# Altium footprint library Toi Library.PcbLib: 740 footprints (part 23 of 47)
Each footprint in its own frame and in the unit in brackets; x right, y up, seen from the top. Pads: shape width x height; smd on the part's side, far side on the other; paste and mask are expansions set on the pad; w line width, h text height; cw(c..) or ccw(c..) is an arc to the next point about the centre after c.
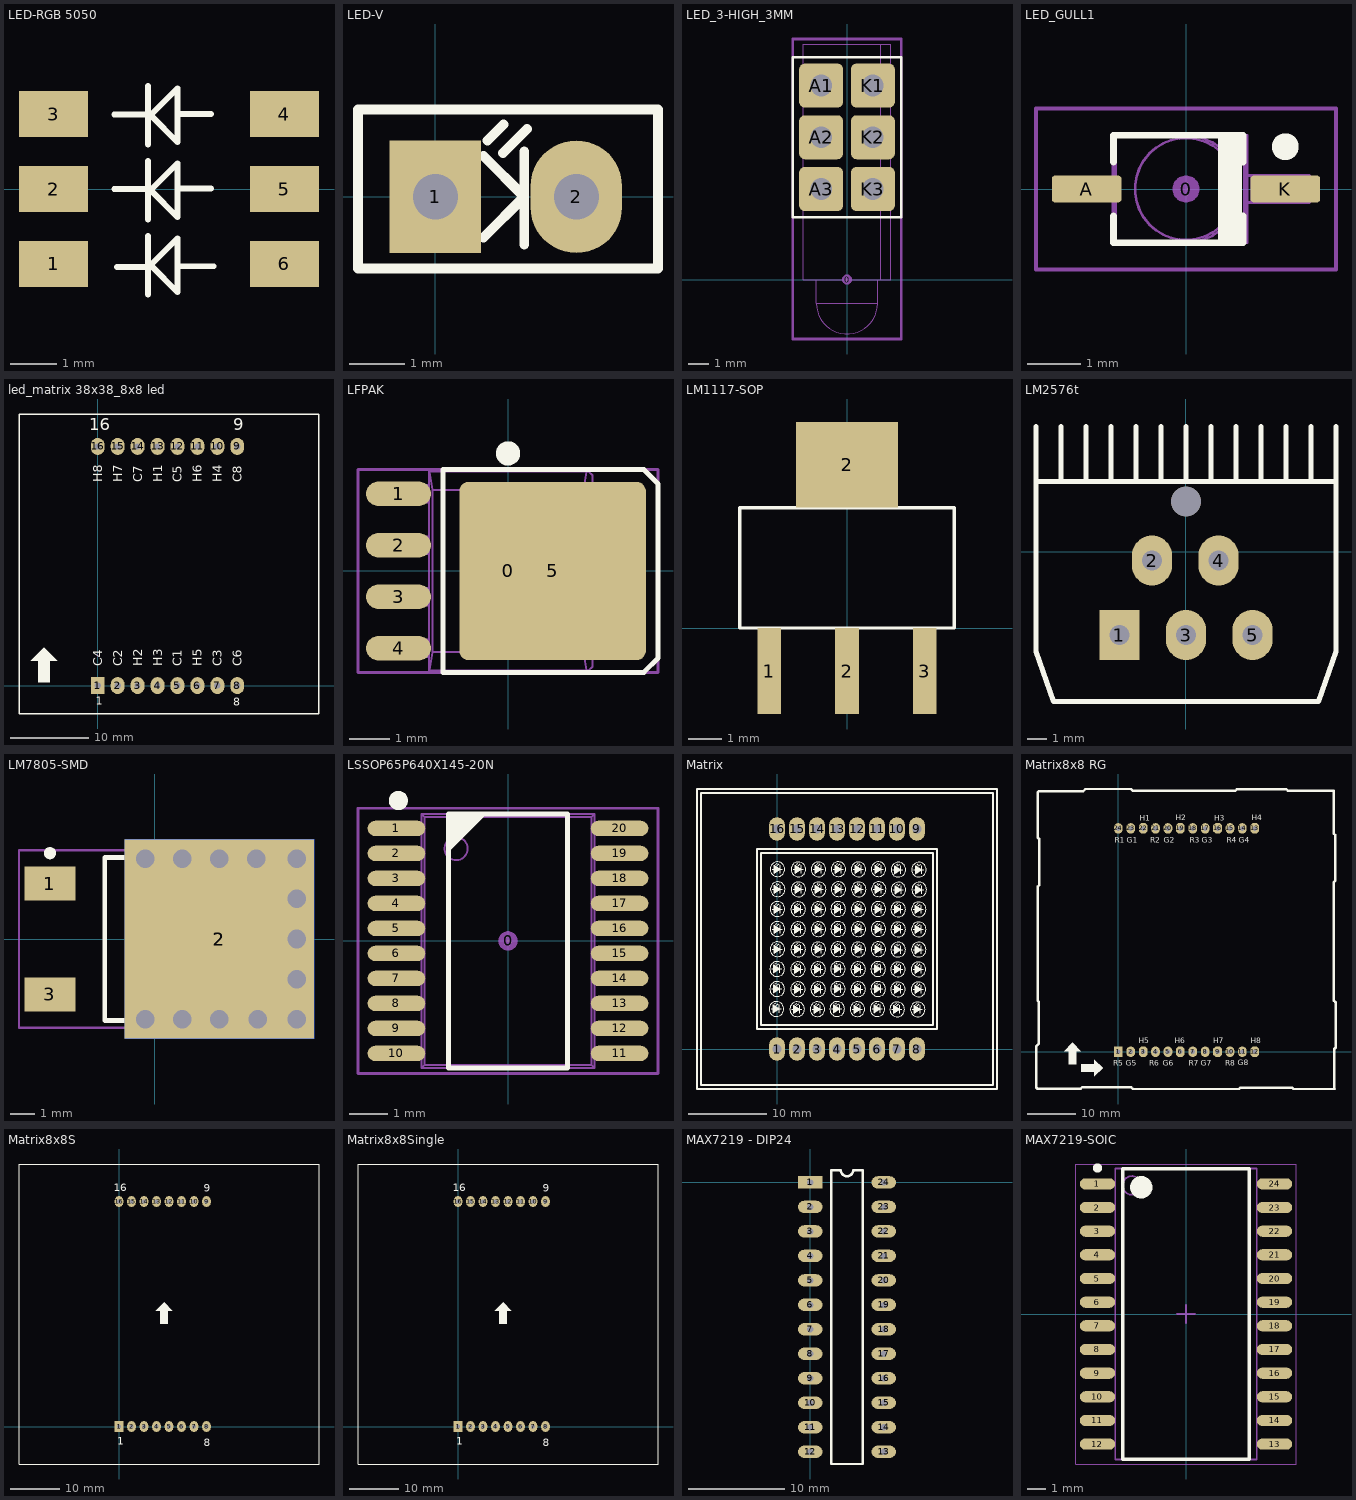
[diagram p22: the footprints below, top view; thin cyan lines are the x and y axes]

## LED-RGB 5050 [mm]
pads (6):
  rect 1.5x1 smd: 1(3.375,-1.625) 2(3.375,0) 3(3.375,1.625) 4(8.375,1.625) 5(8.375,0) 6(8.375,-1.625)
Top Overlay:
  lines w0.127: 4.687,0 5.41,0 ; 4.687,1.611 5.41,1.611 ; 4.75,-1.687 5.473,-1.687 ; 5.424,-2.285 5.424,-1.015 ; 5.424,-0.66 5.424,0.61 ; 5.424,0.965 5.424,2.235 ; 5.5,-1.676 6.059,-2.235 6.059,-1.066 5.5,-1.625 ; 5.5,-0.051 6.059,-0.61 6.059,0.559 5.5,0 ; 5.5,1.574 6.059,1.015 6.059,2.184 5.5,1.625 ; 6.059,0.014 6.782,0.014 ; 6.059,1.625 6.782,1.625 ; 6.121,-1.674 6.844,-1.674
3D body "User Library-APA102C.STEP": height 1.4, standoff -0.15, extent 3.125,-2.5 8.625,2.5

## LED-V [mil] "LED 2 PIN, Rectang Only colour"
height 300
pads (2):
  rect 65x80 hole 32: 1(0,0)
  oval 65x80 hole 32: 2(100,0)
Top Overlay:
  lines w7: 34,-29 63,0 34,29 ; 37,40 48.3,51.3 ; 48,31 65,48 ; 63,-34 63,32 ; -55,-51 158,-51 158,62 -55,62 -55,-51

## LED_3-HIGH_3MM [mil] "LED Circuit Board Indicator Tri-Level"
height 600
pads (7):
  round 20 on Mech15: 0(0,0)
  rrect25% 85x85 hole 42: A1(-50,375) A2(-50,275) A3(-50,175) K1(50,375) K2(50,275) K3(50,175)
Top Overlay:
  lines w5: -105,120 -105,430 105,430 105,120 -105,120
Mechanical 13:
  lines w1.97: -59.06,0 -59.06,-46.06 ; 59.06,0 59.06,-46.06 ; 65.35,0 65.35,455.12 ; -59.06,-46.06 ccw(c0,-46.06) 59.06,-46.06 ; -59.06,-46.06 59.06,-46.06 ; -85.04,0 -85.04,455.12 85.04,455.12 85.04,0 -85.04,0
Mechanical 15:
  lines w5: -105,-115 -105,465 105,465 105,-115 -105,-115
3D body: height 600, standoff -144.88, extent -85.04,-105.11 85.04,455.12

## LED_GULL1 [mm]
pads (3):
  round 0.508 on Mech15: 0(0,0)
  rrect25% 1.3x0.5 smd: A(-1.85,0) K(1.85,0)
Top Overlay:
  circle w0.4: c1.85,0.788 r0.05
  rectangle: 0.6,-1 1.041,1
  lines w0.127: -1.35,-0.5 -1.35,-1 1.067,-1 1.067,-0.5 ; -1.35,0.5 -1.35,1 1.067,1 1.067,0.5
Mechanical 13:
  circle w0.05: c0,0 r0.95
  lines w0.05: -1.9,-0.2 -1.9,0.2 ; -1.77,-0.2 -1.77,0.2 ; -1.499,-0.2 -1.499,0.2 ; -1.36,-0.2 -2.3,-0.2 -2.3,0.2 -1.36,0.2 ; -1.31,-1 -1.31,1 ; -0.001,-1 ccw(c0,0) 0.001,1 ; 1.09,-1 1.09,1 ; 1.14,-0.25 2.3,-0.25 2.3,0.25 1.14,0.25 ; 1.23,-0.25 1.23,0.25 ; 1.499,-0.25 1.499,0.25 ; 1.77,-0.25 1.77,0.25 ; 1.9,-0.25 1.9,0.25 ; -1.36,-1 1.14,-1 1.14,1 -1.36,1 -1.36,-1
Mechanical 15:
  lines w0.076: -2.794,-1.5 -2.794,1.5 2.794,1.5 2.794,-1.5 -2.794,-1.5
3D body "LED_GullWing.STEP": height 2.76, standoff 0, extent -2.3,-1 2.3,1

## led_matrix 38x38_8x8 led [mil]
pads (16):
  rect 70x85 hole 31: 1(0,0)
  oval 70x85 hole 31: 2(100,0) 3(200,0) 4(300,0) 5(400,0) 6(500,0) 7(600,0) 8(700,0) 9(700,1200) 10(600,1200) 11(500,1200) 12(400,1200) 13(300,1200) 14(200,1200) 15(100,1200) 16(0,1200)
Top Overlay:
  region: -336,124 -270,190 -268,190 -203,125 -203,124 -240,124 -240,18 -299,18 -299,124
  lines w7: -395,-140 -395,1360 1110,1360 1110,-140 -395,-140
  text "C6" at 722.49,96 h45
  text "H5" at 522.49,96 h45
  text "C1" at 422.49,96 h45
  text "C2" at 122.49,96 h45
  text "C3" at 622.49,96 h45
  text "C4" at 22.49,96 h45
  text "1" at -10,-95 h40
  text "8" at 680,-100 h40
  text "H3" at 322.49,96 h45
  text "H2" at 222.49,96 h45
  text "H1" at 322.49,1020 h45
  text "H4" at 622.49,1020 h45
  text "16" at -42,1281 h60
  text "9" at 679,1280 h60
  text "C5" at 422.49,1020 h45
  text "H6" at 522.49,1020 h45
  text "H7" at 122.49,1020 h45
  text "C7" at 222.49,1020 h45
  text "H8" at 22.49,1020 h45
  text "C8" at 722.49,1020 h45
3D body "User Library-38x38_8x8_LED.STEP": height 390.36, standoff -176.57, extent -398.03,-148.03 1109.84,1359.84

## LFPAK [mm] "Renesas LFPAK, a variant of SOIC-8; IPC Medium Density"
height 1.1
pads (6):
  round 1 on Mech15: 0(0,0)
  oval 1.6x0.6 smd: 1(-2.7,1.905) 2(-2.7,0.635) 3(-2.7,-0.635) 4(-2.7,-1.905)
  rrect10% 4.6x4.4 smd paste-0.8: 5(1.1,0)
Top Overlay:
  circle w0.3: c0,2.9 r0.15
  lines w0.127: -1.6,-2.5 -1.6,2.5 3.35,2.5 3.7,2.15 3.7,-2.15 3.35,-2.5 -1.6,-2.5
Mechanical 13:
  circle w0.05: c0,1.5 r0.338
  lines w0.05: -2.631,-2.115 -2.631,-1.695 ; -2.631,-0.845 -2.631,-0.425 ; -2.631,0.425 -2.631,0.845 ; -2.631,1.695 -2.631,2.115 ; -2.543,-2.115 -2.543,-1.695 ; -2.543,-0.845 -2.543,-0.425 ; -2.543,0.425 -2.543,0.845 ; -2.543,1.695 -2.543,2.115 ; -2.506,-2.115 -2.506,-1.695 ; -2.506,-0.845 -2.506,-0.425 ; -2.506,0.425 -2.506,0.845 ; -2.506,1.695 -2.506,2.115 ; -2.217,-2.115 -2.217,-1.695 ; -2.217,-0.845 -2.217,-0.425 ; -2.217,0.425 -2.217,0.845 ; -2.217,1.695 -2.217,2.115 ; -1.95,-2.115 -3,-2.115 -3,-1.695 -1.95,-1.695 ; -1.95,-0.845 -3,-0.845 -3,-0.425 -1.95,-0.425 ; -1.95,0.425 -3,0.425 -3,0.845 -1.95,0.845 ; -1.95,1.695 -3,1.695 -3,2.115 -1.95,2.115 ; -1.937,-2.45 -1.858,-2.003 ; -1.937,2.45 -1.858,2.003 ; 1.937,-2.45 1.858,-2.003 ; 1.937,2.45 1.858,2.003 ; 2.085,-1.4 2.085,-2.358 1.993,-2.45 -1.95,-2.45 -1.95,2.45 1.993,2.45 2.085,2.358 2.085,1.4 ; 2.085,-0.6 2.085,0.6 ; -1.858,-2.003 -1.858,2.003 ; -1.858,-2.003 1.858,-2.003 ; -1.858,2.003 1.858,2.003 ; 1.858,-2.003 1.858,2.003 ; 2.028,-1.4 2.3,-1.4 2.3,-2.1 2.55,-2.1 3,-1.65 3,1.65 2.55,2.1 2.3,2.1 2.3,1.4 2.028,1.4 2.028,0.6 2.1,0.6 2.1,-0.6 2.028,-0.6 2.028,-1.4
Mechanical 15:
  lines w0.076: -3.7,-2.5 -3.7,2.5 3.7,2.5 3.7,-2.5 -3.7,-2.5
3D body "LFPAK.STEP": height 1.1, standoff 0, extent -3,-2.45 3,2.45

## LM1117-SOP [mm]
pads (4):
  rect 0.7x2.54 smd: 1(-2.3,-1.27) 2(0,-1.27) 3(2.3,-1.27)
  rect 3x2.54 smd: 2(0,4.826)
Top Overlay:
  lines w0.1: -3.175,0 3.175,0 3.175,3.556 -3.175,3.556 -3.175,0
3D body "SW3DPS-SOT-223-DEFAULT.step": height 1.68, standoff 0, extent -3.25,-1.778 3.25,5.182

## LM2576t [mil]
pads (6):
  rect 80x100 hole 40: 1(-132,-167.09)
  oval 80x100 hole 40: 2(-67,-18) 3(1,-167) 4(66,-18) 5(134,-167)
  round 59.06 hole 59.06: ""(1,100)
Top Overlay:
  lines w10: -299,140 301,140 ; -299,250 -299,-200 -264,-300 266,-300 301,-200 301,250 ; -249,140 -249,250 ; -199,140 -199,250 ; -149,140 -149,250 ; -99,140 -99,250 ; -49,140 -49,250 ; 1,140 1,250 ; 51,140 51,250 ; 101,140 101,250 ; 151,140 151,250 ; 201,140 201,250 ; 251,140 251,250
3D body "SW3dPS-TO220-5.STEP": height 859.05, standoff -85.43, extent -199,-174.91 201,149.5

## LM7805-SMD [mm]
pads (4):
  rect 2.1x1.4 smd: 1(-4.3,2.28) 3(-4.3,-2.28)
  rect 7.8x8.2 smd: 2(2.667,0)
  rect 7.8x8.2 smd far side: 2(2.667,0)
via -0.381,3.302 diameter 1.27 hole 0.762
via 5.842,-3.302 diameter 1.27 hole 0.762
via 4.255,-3.302 diameter 1.27 hole 0.762
via 2.667,-3.302 diameter 1.27 hole 0.762
via 1.143,-3.302 diameter 1.27 hole 0.762
via -0.381,-3.302 diameter 1.27 hole 0.762
via 5.842,3.302 diameter 1.27 hole 0.762
via 4.191,3.302 diameter 1.27 hole 0.762
via 2.667,3.302 diameter 1.27 hole 0.762
via 1.143,3.302 diameter 1.27 hole 0.762
via 5.842,0 diameter 1.27 hole 0.762
via 5.842,1.651 diameter 1.27 hole 0.762
via 5.842,-1.651 diameter 1.27 hole 0.762
Top Overlay:
  circle w0.25: c-4.3,3.53 r0.125
  lines w0.2: -1.2,-3.35 -2.05,-3.35 -2.05,3.35 -1.2,3.35
  lines w0.254: 1.143,3.302 1.206,3.302 ; 4.191,-3.302 4.255,-3.302
Mechanical 13:
  lines w0.1: -2.05,-3.375 4.17,-3.375 4.17,3.375 -2.05,3.375 -2.05,-3.375
Mechanical 15:
  lines w0.1: -5.575,-3.65 5.575,-3.65 5.575,3.65 -5.575,3.65 -5.575,-3.65
3D body "DPAK.stp": height 2.31, standoff 0, extent -4.713,-3.3 5,3.3

## LSSOP65P640X145-20N [mm] "LSSOP, 20-Leads, Body 6.6x4.5mm (max), Pitch 0.65mm, IPC Medium Density"
height 1.45
pads (21):
  round 0.508 on Mech15 mask+0.127: 0(0,0)
  oval 1.5x0.4 smd paste-1 mask+0.127: 1(-2.9,2.925) 2(-2.9,2.275) 3(-2.9,1.625) 4(-2.9,0.975) 5(-2.9,0.325) 6(-2.9,-0.325) 7(-2.9,-0.975) 8(-2.9,-1.625) 9(-2.9,-2.275) 10(-2.9,-2.925) 11(2.9,-2.925) 12(2.9,-2.275) 13(2.9,-1.625) 14(2.9,-0.975) 15(2.9,-0.325) 16(2.9,0.325) 17(2.9,0.975) 18(2.9,1.625) 19(2.9,2.275) 20(2.9,2.925)
Top Overlay:
  circle w0.25: c-2.85,3.65 r0.125
  region: -1.55,3.3 -0.55,3.3 -1.55,2.3
  lines w0.127: -1.55,-3.3 -1.55,3.3 1.55,3.3 1.55,-3.3 -1.55,-3.3
Top Paste:
  region: 3.5,-0.825 2.3,-0.825 2.3,-1.125 3.5,-1.125
  region: 3.5,-0.175 2.3,-0.175 2.3,-0.475 3.5,-0.475
  region: 3.5,0.475 2.3,0.475 2.3,0.175 3.5,0.175
  region: 3.5,1.125 2.3,1.125 2.3,0.825 3.5,0.825
  region: 3.5,1.775 2.3,1.775 2.3,1.475 3.5,1.475
  region: 3.5,2.425 2.3,2.425 2.3,2.125 3.5,2.125
  region: 3.5,3.075 2.3,3.075 2.3,2.775 3.5,2.775
  rectangle: -3.5,2.775 -2.3,3.075
  rectangle: -3.5,2.125 -2.3,2.425
  rectangle: -3.5,1.475 -2.3,1.775
  rectangle: -3.5,0.825 -2.3,1.125
  rectangle: -3.5,0.175 -2.3,0.475
  rectangle: -3.5,-0.475 -2.3,-0.175
  rectangle: -3.5,-1.125 -2.3,-0.825
  rectangle: -3.5,-3.075 -2.3,-2.775
  rectangle: -3.5,-2.425 -2.3,-2.125
  rectangle: -3.5,-1.775 -2.3,-1.475
  region: 3.5,-1.475 2.3,-1.475 2.3,-1.775 3.5,-1.775
  region: 3.5,-2.125 2.3,-2.125 2.3,-2.425 3.5,-2.425
  region: 3.5,-2.775 2.3,-2.775 2.3,-3.075 3.5,-3.075
Mechanical 13:
  drawing of 153 lines, arcs and shapes, not listed
Mechanical 15:
  lines w0.076: -3.9,-3.45 -3.9,3.45 3.9,3.45 3.9,-3.45 -3.9,-3.45
3D body: height 1.45, standoff 0, extent -3.3,-3.3 3.3,3.3

## Matrix [mm]
pads (16):
  oval 2x3 hole 1.2: 1(0,0) 2(2.54,0) 3(5.08,0) 4(7.62,0) 5(10.16,0) 6(12.7,0) 7(15.24,0) 8(17.78,0) 9(17.78,27.94) 10(15.24,27.94) 11(12.7,27.94) 12(10.16,27.94) 13(7.62,27.94) 14(5.08,27.94) 15(2.54,27.94) 16(0,27.94)
Top Overlay:
  drawing of 592 lines, arcs and shapes, not listed
3D body "User Library-Bicolor-LED-Matrix.step": height 8.02, standoff -5.98, extent -7.364,-2.157 24.636,29.843

## Matrix8x8 RG [mil] "Matran 8x8 2mau,Body 60 X 60mm"
height 300
pads (24):
  rect 70x85 hole 37.4: 1(0,0)
  oval 70x85 hole 37.4: 2(100,0) 4(300,0) 5(400,0) 7(600,0) 8(700,0) 10(900,0) 11(1000,0) 14(1000,1800) 15(900,1800) 17(700,1800) 18(600,1800) 20(400,1800) 21(300,1800) 23(100,1800) 24(0,1800)
  oct 70x85 hole 37.4: 3(200,0) 6(500,0) 9(800,0) 12(1100,0) 13(1100,1800) 16(800,1800) 19(500,1800) 22(200,1800)
Top Overlay:
  region: -193,-63 -127,-129 -127,-131 -192,-196 -193,-196 -193,-159 -299,-159 -299,-100 -193,-100
  region: -437,5 -371,71 -369,71 -304,6 -304,5 -341,5 -341,-101 -400,-101 -400,5
  lines w20: -650,-300 -661,-289 -661,45 -640,66 -640,403 -650,413 -650,1331 -639,1342 -639,1716 -650,1727 -650,2090 -640,2100 -283,2100 -265,2118 103,2118 119,2102 941,2102 955,2116 1355,2116 1369,2102 1736,2102 1738,2100 1738,1757 1749,1746 1749,1379 1738,1368 1738,412 1752,398 1752,33 1742,23 1742,-299 1743,-300 1412,-300 1400,-288 984,-288 972,-300 117,-300 103,-286 -292,-286 -304,-298 -648,-298
  text "R4" at 874,1685 h45
  text "G4" at 970,1686 h45
  text "H4" at 1076,1865 h45
  text "R3" at 576,1684 h45
  text "G3" at 672,1685 h45
  text "H3" at 773,1864 h45
  text "R2" at 258,1685 h45
  text "G2" at 366,1685 h45
  text "H2" at 464,1865 h45
  text "H1" at 174,1864 h45
  text "G1" at 68,1685 h45
  text "R1" at -28,1684 h45
  text "R5" at -40,-112 h45
  text "G5" at 60,-111 h45
  text "H5" at 166,68 h45
  text "H6" at 456,69 h45
  text "G6" at 358,-111 h45
  text "R6" at 250,-111 h45
  text "H7" at 765,68 h45
  text "G7" at 664,-111 h45
  text "R7" at 568,-112 h45
  text "H8" at 1068,69 h45
  text "G8" at 962,-110 h45
  text "R8" at 863,-111 h45
Bottom Overlay:
  text "R4" at 943,1685 h45
  text "G4" at 1039,1686 h45
  text "H4" at 1145,1865 h45
  text "R3" at 645,1684 h45
  text "G3" at 741,1685 h45
  text "H3" at 842,1864 h45
  text "R2" at 327,1685 h45
  text "G2" at 435,1685 h45
  text "H2" at 533,1865 h45
  text "H1" at 243,1864 h45
  text "G1" at 137,1685 h45
  text "R1" at 41,1684 h45
  text "R5" at 29,-112 h45
  text "G5" at 129,-111 h45
  text "H5" at 235,68 h45
  text "H6" at 525,69 h45
  text "G6" at 427,-111 h45
  text "R6" at 319,-111 h45
  text "H7" at 834,68 h45
  text "G7" at 733,-111 h45
  text "R7" at 637,-112 h45
  text "H8" at 1137,69 h45
  text "G8" at 1031,-110 h45
  text "R8" at 932,-111 h45
3D body: height 300, standoff 100, extent -648,-298 1752,2102
3D body: height 309, standoff 299, extent -648,-293 1752,2102
3D body: height 310, standoff 299, extent -604,1840.48 -396.41,2045.48
3D body: height 310, standoff 299, extent -298.97,1837.69 -91.38,2042.69
3D body: height 310, standoff 299, extent 2.87,1840.59 210.46,2045.59
3D body: height 310, standoff 299, extent 295.44,1839.3 503.03,2044.3
3D body: height 310, standoff 299, extent 592.24,1837 799.83,2042
3D body: height 310, standoff 299, extent 892,1832 1099.59,2037
3D body: height 310, standoff 299, extent 1182,1837 1389.59,2042
3D body: height 310, standoff 299, extent 1493.67,1837.8 1701.26,2042.8
3D body: height 310, standoff 299, extent 1490.16,1539.32 1697.75,1744.32
3D body: height 310, standoff 299, extent 1178.49,1538.52 1386.08,1743.52
3D body: height 310, standoff 299, extent 888.49,1533.52 1096.08,1738.52
3D body: height 310, standoff 299, extent 588.73,1538.52 796.32,1743.52
3D body: height 310, standoff 299, extent 291.93,1540.82 499.52,1745.82
3D body: height 310, standoff 299, extent -0.64,1542.11 206.95,1747.11
3D body: height 310, standoff 299, extent -302.48,1539.22 -94.89,1744.22
3D body: height 310, standoff 299, extent -607.52,1542 -399.92,1747
3D body: height 310, standoff 299, extent 1490.16,1239.32 1697.75,1444.32
3D body: height 310, standoff 299, extent 1178.49,1238.52 1386.08,1443.52
3D body: height 310, standoff 299, extent 888.49,1233.52 1096.08,1438.52
3D body: height 310, standoff 299, extent 588.73,1238.52 796.32,1443.52
3D body: height 310, standoff 299, extent 291.93,1240.82 499.52,1445.82
3D body: height 310, standoff 299, extent -0.64,1242.11 206.95,1447.11
3D body: height 310, standoff 299, extent -302.48,1239.22 -94.89,1444.22
3D body: height 310, standoff 299, extent -607.52,1242 -399.92,1447
3D body: height 310, standoff 299, extent 1490.16,939.32 1697.75,1144.32
3D body: height 310, standoff 299, extent 1178.49,938.52 1386.08,1143.52
3D body: height 310, standoff 299, extent 888.49,933.52 1096.08,1138.52
3D body: height 310, standoff 299, extent 588.73,938.52 796.32,1143.52
3D body: height 310, standoff 299, extent 291.93,940.82 499.52,1145.82
3D body: height 310, standoff 299, extent -0.64,942.11 206.95,1147.11
3D body: height 310, standoff 299, extent -302.48,939.22 -94.89,1144.22
3D body: height 310, standoff 299, extent -607.52,942 -399.92,1147
3D body: height 310, standoff 299, extent 1490.16,639.32 1697.75,844.32
3D body: height 310, standoff 299, extent 1178.49,638.52 1386.08,843.52
3D body: height 310, standoff 299, extent 888.49,633.52 1096.08,838.52
3D body: height 310, standoff 299, extent 588.73,638.52 796.32,843.52
3D body: height 310, standoff 299, extent 291.93,640.82 499.52,845.82
3D body: height 310, standoff 299, extent -0.64,642.11 206.95,847.11
3D body: height 310, standoff 299, extent -302.48,639.22 -94.89,844.22
3D body: height 310, standoff 299, extent -607.52,642 -399.92,847
3D body: height 310, standoff 299, extent 1490.16,339.32 1697.75,544.32
3D body: height 310, standoff 299, extent 1178.49,338.52 1386.08,543.52
3D body: height 310, standoff 299, extent 888.49,333.52 1096.08,538.52
3D body: height 310, standoff 299, extent 588.73,338.52 796.32,543.52
3D body: height 310, standoff 299, extent 291.93,340.82 499.52,545.82
3D body: height 310, standoff 299, extent -0.64,342.11 206.95,547.11
3D body: height 310, standoff 299, extent -302.48,339.22 -94.89,544.22
3D body: height 310, standoff 299, extent -607.52,342 -399.92,547
3D body: height 310, standoff 299, extent 1490.16,39.32 1697.75,244.32
3D body: height 310, standoff 299, extent 1178.49,38.52 1386.08,243.52
3D body: height 310, standoff 299, extent 888.49,33.52 1096.08,238.52
3D body: height 310, standoff 299, extent 588.73,38.52 796.32,243.52
3D body: height 310, standoff 299, extent 291.93,40.82 499.52,245.82
3D body: height 310, standoff 299, extent -0.64,42.11 206.95,247.11
3D body: height 310, standoff 299, extent -302.48,39.22 -94.89,244.22
3D body: height 310, standoff 299, extent -607.52,42 -399.92,247
3D body: height 310, standoff 299, extent 1490.16,-260.68 1697.75,-55.68
3D body: height 310, standoff 299, extent 1178.49,-261.48 1386.08,-56.48
3D body: height 310, standoff 299, extent 888.49,-266.48 1096.08,-61.48
3D body: height 310, standoff 299, extent 588.73,-261.48 796.32,-56.48
3D body: height 310, standoff 299, extent 291.93,-259.18 499.52,-54.18
3D body: height 310, standoff 299, extent -0.64,-257.89 206.95,-52.89
3D body: height 310, standoff 299, extent -302.48,-260.78 -94.89,-55.78
3D body: height 310, standoff 299, extent -607.52,-258 -399.92,-53
3D body: height 150, standoff -100, extent 1086.47,1785.67 1116.47,1815.67
3D body: height 150, standoff -100, extent 1086.33,-14.47 1116.33,15.53
3D body: height 150, standoff -100, extent 986.33,-14.47 1016.33,15.53
3D body: height 150, standoff -100, extent 886.33,-14.47 916.33,15.53
3D body: height 150, standoff -100, extent 786.33,-14.47 816.33,15.53
3D body: height 150, standoff -100, extent 686.33,-14.47 716.33,15.53
3D body: height 150, standoff -100, extent 586.33,-14.47 616.33,15.53
3D body: height 150, standoff -100, extent 486.33,-14.47 516.33,15.53
3D body: height 150, standoff -100, extent 386.33,-14.47 416.33,15.53
3D body: height 150, standoff -100, extent 286.33,-14.47 316.33,15.53
3D body: height 150, standoff -100, extent 186.33,-14.47 216.33,15.53
3D body: height 150, standoff -100, extent 86.33,-14.47 116.33,15.53
3D body: height 150, standoff -100, extent -13.67,-14.47 16.33,15.53
3D body: height 150, standoff -100, extent 986.33,1785.53 1016.33,1815.53
3D body: height 150, standoff -100, extent 886.33,1785.53 916.33,1815.53
3D body: height 150, standoff -100, extent 786.33,1785.53 816.33,1815.53
3D body: height 150, standoff -100, extent 686.33,1785.53 716.33,1815.53
3D body: height 150, standoff -100, extent 586.33,1785.53 616.33,1815.53
3D body: height 150, standoff -100, extent 486.33,1785.53 516.33,1815.53
3D body: height 150, standoff -100, extent 386.33,1785.53 416.33,1815.53
3D body: height 150, standoff -100, extent 286.33,1785.53 316.33,1815.53
3D body: height 150, standoff -100, extent 186.33,1785.53 216.33,1815.53
3D body: height 150, standoff -100, extent 86.33,1785.53 116.33,1815.53
3D body: height 150, standoff -100, extent -13.67,1785.53 16.33,1815.53

## Matrix8x8S [mil] "Matran 8x8, Body 60 X 60mm"
height 300
pads (16):
  rect 70x85 hole 31: 1(0,0)
  oval 70x85 hole 31: 2(100,0) 3(200,0) 4(300,0) 5(400,0) 6(500,0) 7(600,0) 8(700,0) 9(700,1800) 10(600,1800) 11(500,1800) 12(400,1800) 13(300,1800) 14(200,1800) 15(100,1800) 16(0,1800)
Top Overlay:
  region: 294,927 360,993 362,993 427,928 427,927 390,927 390,821 331,821 331,927
  lines w7: -800,-300 -800,2100 ; -800,-300 -800,2100 ; -800,-300 1600,-300 ; -800,-300 1600,-300 ; -800,2100 1600,2100 ; -800,2100 1600,2100 ; 1600,-300 1600,2100 ; 1600,-300 1600,2100
  text "16" at -42,1881 h60
  text "9" at 679,1880 h60
  text "8" at 678,-156 h60
  text "1" at -15,-144 h60
3D body: height 300, standoff 100, extent -800,-300 1600,2100
3D body: height 309, standoff 299, extent -800,-295 1600,2100
3D body: height 310, standoff 299, extent -756,1838.48 -548.41,2043.48
3D body: height 310, standoff 299, extent -450.97,1835.69 -243.38,2040.69
3D body: height 310, standoff 299, extent -149.13,1838.59 58.46,2043.59
3D body: height 310, standoff 299, extent 143.44,1837.3 351.03,2042.3
3D body: height 310, standoff 299, extent 440.24,1835 647.83,2040
3D body: height 310, standoff 299, extent 740,1830 947.59,2035
3D body: height 310, standoff 299, extent 1030,1835 1237.59,2040
3D body: height 310, standoff 299, extent 1341.67,1835.8 1549.26,2040.8
3D body: height 310, standoff 299, extent 1338.16,1537.32 1545.75,1742.32
3D body: height 310, standoff 299, extent 1026.49,1536.52 1234.08,1741.52
3D body: height 310, standoff 299, extent 736.49,1531.52 944.08,1736.52
3D body: height 310, standoff 299, extent 436.73,1536.52 644.32,1741.52
3D body: height 310, standoff 299, extent 139.93,1538.82 347.52,1743.82
3D body: height 310, standoff 299, extent -152.64,1540.11 54.95,1745.11
3D body: height 310, standoff 299, extent -454.48,1537.22 -246.89,1742.22
3D body: height 310, standoff 299, extent -759.52,1540 -551.92,1745
3D body: height 310, standoff 299, extent 1338.16,1237.32 1545.75,1442.32
3D body: height 310, standoff 299, extent 1026.49,1236.52 1234.08,1441.52
3D body: height 310, standoff 299, extent 736.49,1231.52 944.08,1436.52
3D body: height 310, standoff 299, extent 436.73,1236.52 644.32,1441.52
3D body: height 310, standoff 299, extent 139.93,1238.82 347.52,1443.82
3D body: height 310, standoff 299, extent -152.64,1240.11 54.95,1445.11
3D body: height 310, standoff 299, extent -454.48,1237.22 -246.89,1442.22
3D body: height 310, standoff 299, extent -759.52,1240 -551.92,1445
3D body: height 310, standoff 299, extent 1338.16,937.32 1545.75,1142.32
3D body: height 310, standoff 299, extent 1026.49,936.52 1234.08,1141.52
3D body: height 310, standoff 299, extent 736.49,931.52 944.08,1136.52
3D body: height 310, standoff 299, extent 436.73,936.52 644.32,1141.52
3D body: height 310, standoff 299, extent 139.93,938.82 347.52,1143.82
3D body: height 310, standoff 299, extent -152.64,940.11 54.95,1145.11
3D body: height 310, standoff 299, extent -454.48,937.22 -246.89,1142.22
3D body: height 310, standoff 299, extent -759.52,940 -551.92,1145
3D body: height 310, standoff 299, extent 1338.16,637.32 1545.75,842.32
3D body: height 310, standoff 299, extent 1026.49,636.52 1234.08,841.52
3D body: height 310, standoff 299, extent 736.49,631.52 944.08,836.52
3D body: height 310, standoff 299, extent 436.73,636.52 644.32,841.52
3D body: height 310, standoff 299, extent 139.93,638.82 347.52,843.82
3D body: height 310, standoff 299, extent -152.64,640.11 54.95,845.11
3D body: height 310, standoff 299, extent -454.48,637.22 -246.89,842.22
3D body: height 310, standoff 299, extent -759.52,640 -551.92,845
3D body: height 310, standoff 299, extent 1338.16,337.32 1545.75,542.32
3D body: height 310, standoff 299, extent 1026.49,336.52 1234.08,541.52
3D body: height 310, standoff 299, extent 736.49,331.52 944.08,536.52
3D body: height 310, standoff 299, extent 436.73,336.52 644.32,541.52
3D body: height 310, standoff 299, extent 139.93,338.82 347.52,543.82
3D body: height 310, standoff 299, extent -152.64,340.11 54.95,545.11
3D body: height 310, standoff 299, extent -454.48,337.22 -246.89,542.22
3D body: height 310, standoff 299, extent -759.52,340 -551.92,545
3D body: height 310, standoff 299, extent 1338.16,37.32 1545.75,242.32
3D body: height 310, standoff 299, extent 1026.49,36.52 1234.08,241.52
3D body: height 310, standoff 299, extent 736.49,31.52 944.08,236.52
3D body: height 310, standoff 299, extent 436.73,36.52 644.32,241.52
3D body: height 310, standoff 299, extent 139.93,38.82 347.52,243.82
3D body: height 310, standoff 299, extent -152.64,40.11 54.95,245.11
3D body: height 310, standoff 299, extent -454.48,37.22 -246.89,242.22
3D body: height 310, standoff 299, extent -759.52,40 -551.92,245
3D body: height 310, standoff 299, extent 1338.16,-262.68 1545.75,-57.68
3D body: height 310, standoff 299, extent 1026.49,-263.48 1234.08,-58.48
3D body: height 310, standoff 299, extent 736.49,-268.48 944.08,-63.48
3D body: height 310, standoff 299, extent 436.73,-263.48 644.32,-58.48
3D body: height 310, standoff 299, extent 139.93,-261.18 347.52,-56.18
3D body: height 310, standoff 299, extent -152.64,-259.89 54.95,-54.89
3D body: height 310, standoff 299, extent -454.48,-262.78 -246.89,-57.78
3D body: height 310, standoff 299, extent -759.52,-260 -551.92,-55
3D body: height 150, standoff -100, extent -15,1785 15,1815
3D body: height 150, standoff -100, extent 85,1785 115,1815
3D body: height 150, standoff -100, extent 185,1785 215,1815
3D body: height 150, standoff -100, extent 285,1785 315,1815
3D body: height 150, standoff -100, extent 385,1785 415,1815
3D body: height 150, standoff -100, extent 485,1785 515,1815
3D body: height 150, standoff -100, extent 585,1785 615,1815
3D body: height 150, standoff -100, extent 685,1785 715,1815
3D body: height 150, standoff -100, extent -15,-15 15,15
3D body: height 150, standoff -100, extent 85,-15 115,15
3D body: height 150, standoff -100, extent 185,-15 215,15
3D body: height 150, standoff -100, extent 285,-15 315,15
3D body: height 150, standoff -100, extent 385,-15 415,15
3D body: height 150, standoff -100, extent 485,-15 515,15
3D body: height 150, standoff -100, extent 585,-15 615,15
3D body: height 150, standoff -100, extent 685,-15 715,15

## Matrix8x8Single [mil]
pads (16):
  rect 70x85 hole 31: 1(0,0)
  oval 70x85 hole 31: 2(100,0) 3(200,0) 4(300,0) 5(400,0) 6(500,0) 7(600,0) 8(700,0) 9(700,1800) 10(600,1800) 11(500,1800) 12(400,1800) 13(300,1800) 14(200,1800) 15(100,1800) 16(0,1800)
Top Overlay:
  region: 294,927 360,993 362,993 427,928 427,927 390,927 390,821 331,821 331,927
  lines w7: -800,-300 1600,-300 ; -800,-300 1600,-300 ; -800,-300 -800,2100 ; -800,-300 -800,2100 ; -800,2100 1600,2100 ; -800,2100 1600,2100 ; 1600,-300 1600,2100 ; 1600,-300 1600,2100
  text "1" at -15,-144 h60
  text "8" at 678,-156 h60
  text "9" at 679,1880 h60
  text "16" at -42,1881 h60
3D body: height 150, standoff -100, extent 685,-15 715,15
3D body: height 150, standoff -100, extent 585,-15 615,15
3D body: height 150, standoff -100, extent 485,-15 515,15
3D body: height 150, standoff -100, extent 385,-15 415,15
3D body: height 150, standoff -100, extent 285,-15 315,15
3D body: height 150, standoff -100, extent 185,-15 215,15
3D body: height 150, standoff -100, extent 85,-15 115,15
3D body: height 150, standoff -100, extent -15,-15 15,15
3D body: height 150, standoff -100, extent 685,1785 715,1815
3D body: height 150, standoff -100, extent 585,1785 615,1815
3D body: height 150, standoff -100, extent 485,1785 515,1815
3D body: height 150, standoff -100, extent 385,1785 415,1815
3D body: height 150, standoff -100, extent 285,1785 315,1815
3D body: height 150, standoff -100, extent 185,1785 215,1815
3D body: height 150, standoff -100, extent 85,1785 115,1815
3D body: height 150, standoff -100, extent -15,1785 15,1815
3D body: height 310, standoff 299, extent -759.52,-260 -551.92,-55
3D body: height 310, standoff 299, extent -454.48,-262.78 -246.89,-57.78
3D body: height 310, standoff 299, extent -152.64,-259.89 54.95,-54.89
3D body: height 310, standoff 299, extent 139.93,-261.18 347.52,-56.18
3D body: height 310, standoff 299, extent 436.73,-263.48 644.32,-58.48
3D body: height 310, standoff 299, extent 736.49,-268.48 944.08,-63.48
3D body: height 310, standoff 299, extent 1026.49,-263.48 1234.08,-58.48
3D body: height 310, standoff 299, extent 1338.16,-262.68 1545.75,-57.68
3D body: height 310, standoff 299, extent -759.52,40 -551.92,245
3D body: height 310, standoff 299, extent -454.48,37.22 -246.89,242.22
3D body: height 310, standoff 299, extent -152.64,40.11 54.95,245.11
3D body: height 310, standoff 299, extent 139.93,38.82 347.52,243.82
3D body: height 310, standoff 299, extent 436.73,36.52 644.32,241.52
3D body: height 310, standoff 299, extent 736.49,31.52 944.08,236.52
3D body: height 310, standoff 299, extent 1026.49,36.52 1234.08,241.52
3D body: height 310, standoff 299, extent 1338.16,37.32 1545.75,242.32
3D body: height 310, standoff 299, extent -759.52,340 -551.92,545
3D body: height 310, standoff 299, extent -454.48,337.22 -246.89,542.22
3D body: height 310, standoff 299, extent -152.64,340.11 54.95,545.11
3D body: height 310, standoff 299, extent 139.93,338.82 347.52,543.82
3D body: height 310, standoff 299, extent 436.73,336.52 644.32,541.52
3D body: height 310, standoff 299, extent 736.49,331.52 944.08,536.52
3D body: height 310, standoff 299, extent 1026.49,336.52 1234.08,541.52
3D body: height 310, standoff 299, extent 1338.16,337.32 1545.75,542.32
3D body: height 310, standoff 299, extent -759.52,640 -551.92,845
3D body: height 310, standoff 299, extent -454.48,637.22 -246.89,842.22
3D body: height 310, standoff 299, extent -152.64,640.11 54.95,845.11
3D body: height 310, standoff 299, extent 139.93,638.82 347.52,843.82
3D body: height 310, standoff 299, extent 436.73,636.52 644.32,841.52
3D body: height 310, standoff 299, extent 736.49,631.52 944.08,836.52
3D body: height 310, standoff 299, extent 1026.49,636.52 1234.08,841.52
3D body: height 310, standoff 299, extent 1338.16,637.32 1545.75,842.32
3D body: height 310, standoff 299, extent -759.52,940 -551.92,1145
3D body: height 310, standoff 299, extent -454.48,937.22 -246.89,1142.22
3D body: height 310, standoff 299, extent -152.64,940.11 54.95,1145.11
3D body: height 310, standoff 299, extent 139.93,938.82 347.52,1143.82
3D body: height 310, standoff 299, extent 436.73,936.52 644.32,1141.52
3D body: height 310, standoff 299, extent 736.49,931.52 944.08,1136.52
3D body: height 310, standoff 299, extent 1026.49,936.52 1234.08,1141.52
3D body: height 310, standoff 299, extent 1338.16,937.32 1545.75,1142.32
3D body: height 310, standoff 299, extent -759.52,1240 -551.92,1445
3D body: height 310, standoff 299, extent -454.48,1237.22 -246.89,1442.22
3D body: height 310, standoff 299, extent -152.64,1240.11 54.95,1445.11
3D body: height 310, standoff 299, extent 139.93,1238.82 347.52,1443.82
3D body: height 310, standoff 299, extent 436.73,1236.52 644.32,1441.52
3D body: height 310, standoff 299, extent 736.49,1231.52 944.08,1436.52
3D body: height 310, standoff 299, extent 1026.49,1236.52 1234.08,1441.52
3D body: height 310, standoff 299, extent 1338.16,1237.32 1545.75,1442.32
3D body: height 310, standoff 299, extent -759.52,1540 -551.92,1745
3D body: height 310, standoff 299, extent -454.48,1537.22 -246.89,1742.22
3D body: height 310, standoff 299, extent -152.64,1540.11 54.95,1745.11
3D body: height 310, standoff 299, extent 139.93,1538.82 347.52,1743.82
3D body: height 310, standoff 299, extent 436.73,1536.52 644.32,1741.52
3D body: height 310, standoff 299, extent 736.49,1531.52 944.08,1736.52
3D body: height 310, standoff 299, extent 1026.49,1536.52 1234.08,1741.52
3D body: height 310, standoff 299, extent 1338.16,1537.32 1545.75,1742.32
3D body: height 310, standoff 299, extent 1341.67,1835.8 1549.26,2040.8
3D body: height 310, standoff 299, extent 1030,1835 1237.59,2040
3D body: height 310, standoff 299, extent 740,1830 947.59,2035
3D body: height 310, standoff 299, extent 440.24,1835 647.83,2040
3D body: height 310, standoff 299, extent 143.44,1837.3 351.03,2042.3
3D body: height 310, standoff 299, extent -149.13,1838.59 58.46,2043.59
3D body: height 310, standoff 299, extent -450.97,1835.69 -243.38,2040.69
3D body: height 310, standoff 299, extent -756,1838.48 -548.41,2043.48
3D body: height 309, standoff 299, extent -800,-295 1600,2100
3D body: height 300, standoff 100, extent -800,-300 1600,2100

## MAX7219 - DIP24 [mm]
pads (24):
  rect 2.54x1.27 hole 0.635: 1(0,0)
  oval 2.54x1.27 hole 0.635: 2(0,-2.54) 3(0,-5.08) 4(0,-7.62) 5(0,-10.16) 6(0,-12.7) 7(0,-15.24) 8(0,-17.78) 9(0,-20.32) 10(0,-22.86) 11(0,-25.4) 12(0,-27.94) 13(7.62,-27.94) 14(7.62,-25.4) 15(7.62,-22.86) 16(7.62,-20.32) 17(7.62,-17.78) 18(7.62,-15.24) 19(7.62,-12.7) 20(7.62,-10.16) 21(7.62,-7.62) 22(7.62,-5.08) 23(7.62,-2.54) 24(7.62,0)
Top Overlay:
  lines w0.254: 2.159,-29.21 2.159,1.27 3.175,1.27 ccw(c3.81,1.27) 4.445,1.27 5.461,1.27 5.461,-29.21 2.159,-29.21

## MAX7219-SOIC [mm] "SOIC, 24-Leads, Body 15.40x7.50mm, Pitch 1.27mm, IPC Medium Density"
height 2.65
pads (24):
  oval 1.9x0.6 smd: 1(-4.75,6.985) 2(-4.75,5.715) 3(-4.75,4.445) 4(-4.75,3.175) 5(-4.75,1.905) 6(-4.75,0.635) 7(-4.75,-0.635) 8(-4.75,-1.905) 9(-4.75,-3.175) 10(-4.75,-4.445) 11(-4.75,-5.715) 12(-4.75,-6.985) 13(4.75,-6.985) 14(4.75,-5.715) 15(4.75,-4.445) 16(4.75,-3.175) 17(4.75,-1.905) 18(4.75,-0.635) 19(4.75,0.635) 20(4.75,1.905) 21(4.75,3.175) 22(4.75,4.445) 23(4.75,5.715) 24(4.75,6.985)
Top Overlay:
  circle w0.6: c-2.4,6.8 r0.3
  circle w0.25: c-4.75,7.835 r0.125
  lines w0.2: -3.4,-7.8 3.4,-7.8 3.4,7.8 -3.4,7.8 -3.4,-7.8
Mechanical 13:
  circle w0.1: c-2.9,6.9 r0.5
  lines w0.1: -3.8,-7.8 3.8,-7.8 3.8,7.8 -3.8,7.8 -3.8,-7.8
Mechanical 15:
  lines w0.05: -5.925,-8.05 5.925,-8.05 5.925,8.05 -5.925,8.05 -5.925,-8.05
  lines w0.1: -0.5,0 0.5,0 ; 0,-0.5 0,0.5
3D body "MAX7219-SOIC.step": height 2.65, standoff 0, extent -5.158,-7.8 5.158,7.8